# Altium footprint library d1_PcbLib.PcbLib: 266 footprints (part 9 of 17)
Each footprint in its own frame and in the unit in brackets; x right, y up, seen from the top. Pads: shape width x height; smd on the part's side, far side on the other; paste and mask are expansions set on the pad; w line width, h text height; cw(c..) or ccw(c..) is an arc to the next point about the centre after c.
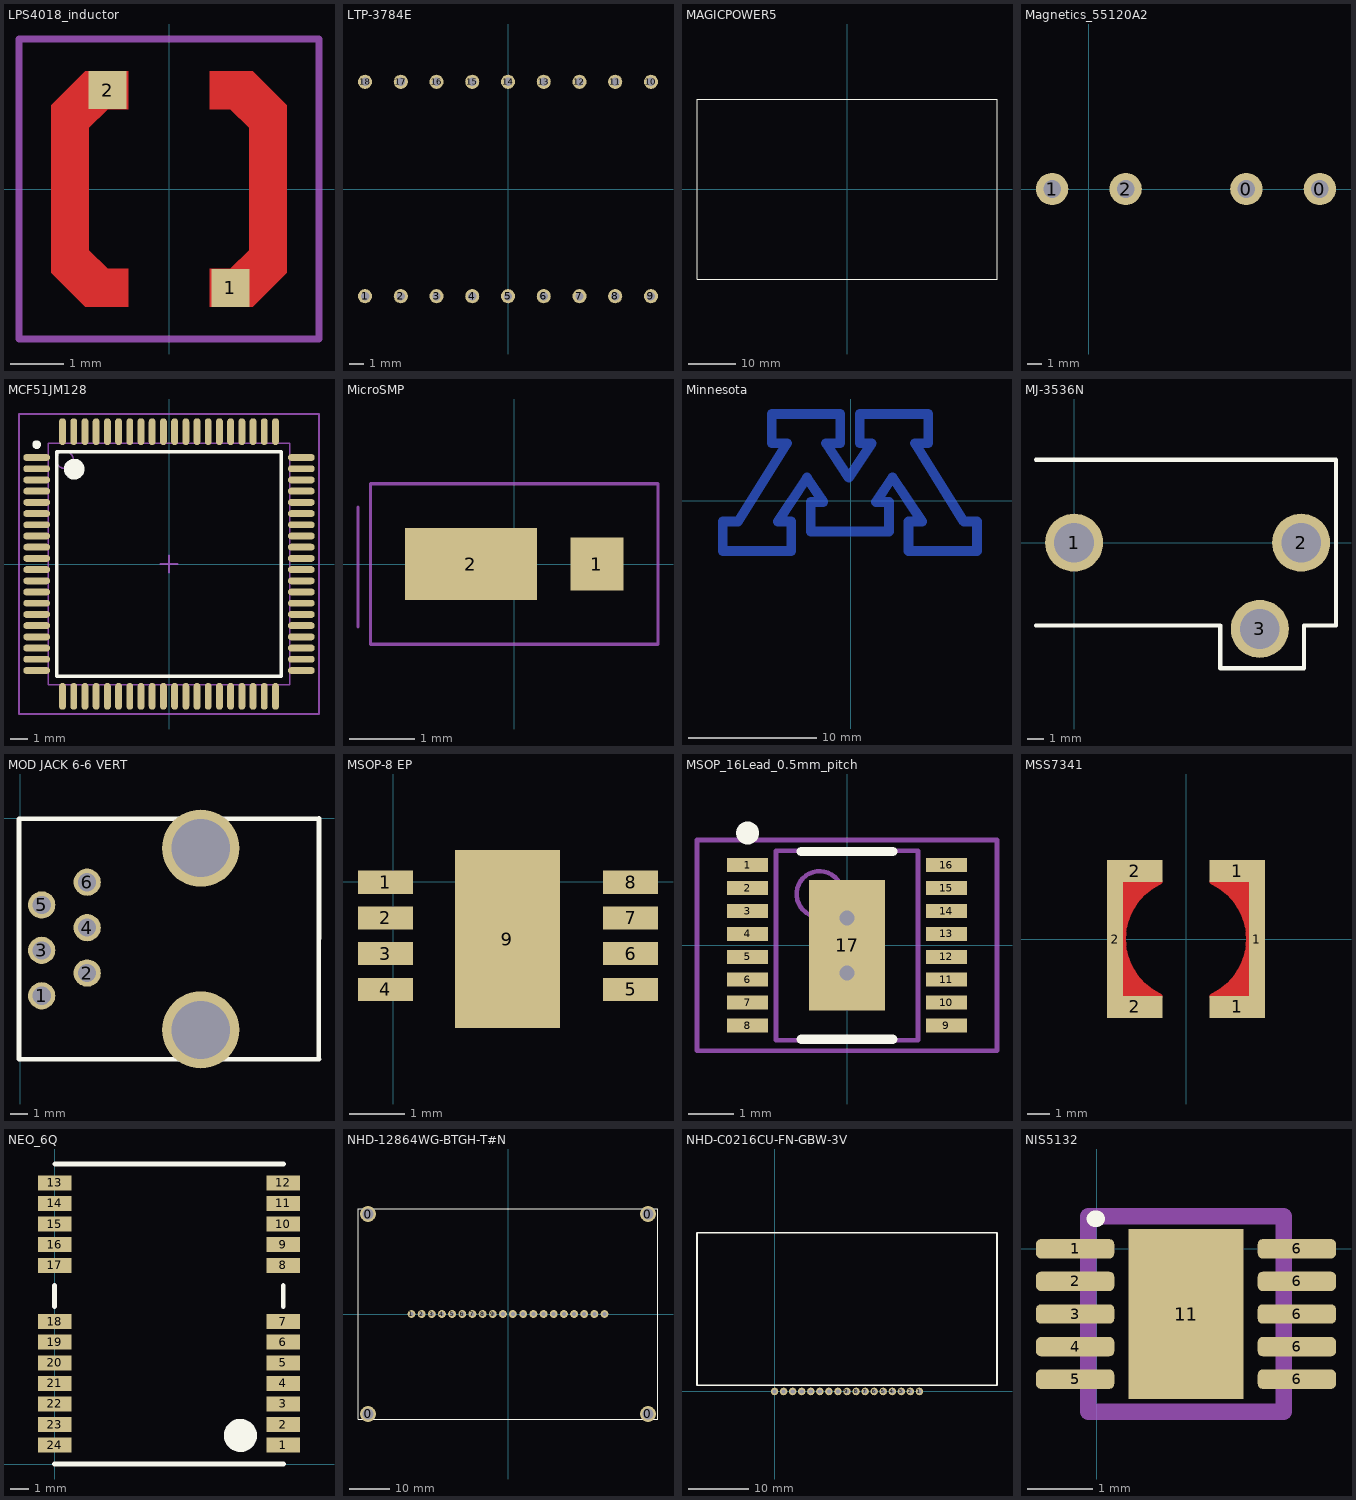
[diagram p8: the footprints below, top view; thin cyan lines are the x and y axes]

## LPS4018_inductor [mil]
height 66
pads (2):
  rect 28x28 smd: 1(45,-72.5) 2(-45,72.5)
Top Layer:
  region: -30,-58.5 -45,-58.5 -59,-45 -59,45 -45,58.5 -30,58.5 -30,86.5 -61.5,86.5 -86.5,61.5 -86.5,-61.5 -61.5,-86.5 -30,-86.5
  region: 30,58.5 45,58.5 59,45 59,-45 45,-58.5 30,-58.5 30,-86.5 61.5,-86.5 86.5,-61.5 86.5,61.5 61.5,86.5 30,86.5
Top Solder:
  region: -55,44.5 -45,54.5 -26,54.5 -26,90.5 -63.5,90.5 -90.5,63.5 -90.5,-63.5 -63.5,-90.5 -26,-90.5 -26,-54.5 -45,-54.5 -55,-45
  region: 55,-44.5 45,-54.5 26,-54.5 26,-90.5 63.5,-90.5 90.5,-63.5 90.5,63.5 63.5,90.5 26,90.5 26,54.5 45,54.5 55,45
Mechanical 15:
  lines w5: -110,-110 110,-110 110,110 -110,110 -110,-110
3D body: height 70.87, standoff 0, extent -80.82,-80.82 80.83,80.83

## LTP-3784E [mm]
pads (18):
  round 1 hole 0.6: 1(-10.16,-7.62) 2(-7.62,-7.62) 3(-5.08,-7.62) 4(-2.54,-7.62) 5(0,-7.62) 6(2.54,-7.62) 7(5.08,-7.62) 8(7.62,-7.62) 9(10.16,-7.62) 10(10.16,7.62) 11(7.62,7.62) 12(5.08,7.62) 13(2.54,7.62) 14(0,7.62) 15(-2.54,7.62) 16(-5.08,7.62) 17(-7.62,7.62) 18(-10.16,7.62)
3D body: height 7.8, standoff 0, extent -12.7,-10.16 12.7,10.16

## MAGICPOWER5 [mm]
Top Overlay:
  lines w0.254: -31.75,-19.05 -31.75,19.05 31.75,19.05 31.75,-19.05 -31.75,-19.05

## Magnetics_55120A2 [mm]
pads (4):
  round 2.2 hole 1.2: 0(10.7,0) 0(15.7,0) 1(-2.5,0) 2(2.5,0)
3D body: height 9.51, standoff 0.21, extent -3.031,-10.031 16.431,9.431

## MCF51JM128 [mm]
height 1.74
pads (80):
  oval 1.55x0.4 smd: 1(-7.675,6.175) 2(-7.675,5.525) 3(-7.675,4.875) 4(-7.675,4.225) 5(-7.675,3.575) 6(-7.675,2.925) 7(-7.675,2.275) 8(-7.675,1.625) 9(-7.675,0.975) 10(-7.675,0.325) 11(-7.675,-0.325) 12(-7.675,-0.975) 13(-7.675,-1.625) 14(-7.675,-2.275) 15(-7.675,-2.925) 16(-7.675,-3.575) 17(-7.675,-4.225) 18(-7.675,-4.875) 19(-7.675,-5.525) 20(-7.675,-6.175) 41(7.675,-6.175) 42(7.675,-5.525) 43(7.675,-4.875) 44(7.675,-4.225) 45(7.675,-3.575) 46(7.675,-2.925) 47(7.675,-2.275) 48(7.675,-1.625) 49(7.675,-0.975) 50(7.675,-0.325) 51(7.675,0.325) 52(7.675,0.975) 53(7.675,1.625) 54(7.675,2.275) 55(7.675,2.925) 56(7.675,3.575) 57(7.675,4.225) 58(7.675,4.875) 59(7.675,5.525) 60(7.675,6.175)
  oval 0.4x1.55 smd: 21(-6.175,-7.675) 22(-5.525,-7.675) 23(-4.875,-7.675) 24(-4.225,-7.675) 25(-3.575,-7.675) 26(-2.925,-7.675) 27(-2.275,-7.675) 28(-1.625,-7.675) 29(-0.975,-7.675) 30(-0.325,-7.675) 31(0.325,-7.675) 32(0.975,-7.675) 33(1.625,-7.675) 34(2.275,-7.675) 35(2.925,-7.675) 36(3.575,-7.675) 37(4.225,-7.675) 38(4.875,-7.675) 39(5.525,-7.675) 40(6.175,-7.675) 61(6.175,7.675) 62(5.525,7.675) 63(4.875,7.675) 64(4.225,7.675) 65(3.575,7.675) 66(2.925,7.675) 67(2.275,7.675) 68(1.625,7.675) 69(0.975,7.675) 70(0.325,7.675) 71(-0.325,7.675) 72(-0.975,7.675) 73(-1.625,7.675) 74(-2.275,7.675) 75(-2.925,7.675) 76(-3.575,7.675) 77(-4.225,7.675) 78(-4.875,7.675) 79(-5.525,7.675) 80(-6.175,7.675)
Top Overlay:
  circle w0.6: c-5.5,5.5 r0.3
  circle w0.25: c-7.675,6.925 r0.125
  lines w0.2: -6.5,-6.5 6.5,-6.5 6.5,6.5 -6.5,6.5 -6.5,-6.5
Mechanical 13:
  circle w0.1: c-6.05,6.05 r0.5
  lines w0.1: -7,-7 7,-7 7,7 -7,7 -7,-7
Mechanical 15:
  lines w0.1: -0.5,0 0.5,0 ; 0,-0.5 0,0.5 ; -8.7,-8.7 8.7,-8.7 8.7,8.7 -8.7,8.7 -8.7,-8.7
3D body: height 1.59, standoff 0, extent -8.001,-8.008 8.008,8.001

## MicroSMP [mil]
pads (2):
  rect 32x32 smd: 1(49.5,0)
  rect 79x43 smd: 2(-26,0)
Mechanical 15:
  lines w2: -93.5,-37.5 -93.5,34 ; -86,-48 86,-48 86,48 -86,48 -86,-48

## Minnesota [mm]
Bottom Layer:
  lines w0.762: -9.957,-3.912 -4.623,-3.912 -4.623,-1.626 -5.681,-1.626 -3.395,1.803 -2.125,-0.102 -3.099,-0.102 -3.099,-2.388 2.997,-2.388 2.997,-0.102 1.981,-0.102 3.272,1.835 5.58,-1.626 4.521,-1.626 4.521,-3.912 9.855,-3.912 9.855,-1.626 8.823,-1.626 5.013,4.47 6.045,4.47 6.045,6.756 0.711,6.756 0.711,4.47 1.643,4.47 -0.135,1.803 -1.913,4.47 -0.813,4.47 -0.813,6.756 -6.147,6.756 -6.147,4.47 -4.956,4.47 -8.766,-1.626 -9.957,-1.626 -9.957,-3.912
Bottom Solder:
  lines w0.762: -10.414,-16.612 -5.08,-16.612 -5.08,-14.326 -6.138,-14.326 -3.852,-10.897 -2.582,-12.802 -3.556,-12.802 -3.556,-15.088 2.54,-15.088 2.54,-12.802 1.524,-12.802 2.815,-10.865 5.122,-14.326 4.064,-14.326 4.064,-16.612 9.398,-16.612 9.398,-14.326 8.366,-14.326 4.556,-8.23 5.588,-8.23 5.588,-5.944 0.254,-5.944 0.254,-8.23 1.185,-8.23 -0.593,-10.897 -2.371,-8.23 -1.27,-8.23 -1.27,-5.944 -6.604,-5.944 -6.604,-8.23 -5.413,-8.23 -9.223,-14.326 -10.414,-14.326 -10.414,-16.612

## MJ-3536N [mm] "CONN AUDIO JACK"
pads (3):
  round 3.5 hole 2.4: 1(0,0) 2(13.7,0) 3(11.2,-5.2)
Top Overlay:
  lines w0.254: -2.3,-5 8.814,-5 8.814,-7.569 13.868,-7.569 13.868,-5 15.8,-5 15.8,5 -2.3,5

## MOD JACK 6-6 VERT [mil]
pads (8):
  round 60 hole 40: 1(47.24,-390.35) 2(147.24,-340.35) 3(47.24,-290.35) 4(147.24,-240.35) 5(47.24,-190.35) 6(147.24,-140.35)
  round 170 hole 128: ""(397.24,-465.35) ""(397.24,-65.35)
Top Overlay:
  lines w10: 657.24,-528.78 657.24,-263.78 ; 657.48,-530.35 -2.76,-530.35 -2.76,-0.35 657.48,-0.35 ; 657.48,-265 657.48,0

## MSOP-8 EP [mm]
pads (9):
  rect 1x0.42 smd: 1(-0.138,-0.008) 2(-0.138,-0.658) 3(-0.138,-1.308) 4(-0.138,-1.959) 5(4.322,-1.959) 6(4.322,-1.308) 7(4.322,-0.658) 8(4.322,-0.008)
  rect 1.905x3.248 smd: 9(2.083,-1.041)

## MSOP_16Lead_0.5mm_pitch [mm] "TSSOP, 16-Leads, Body 4.1x3.1mm (max), Pitch 0.50mm, IPC Medium Density"
height 1.1
pads (17):
  rect 0.889x0.305 smd: 1(-2.171,1.75) 2(-2.171,1.25) 3(-2.171,0.75) 4(-2.171,0.25) 5(-2.171,-0.25) 6(-2.171,-0.75) 7(-2.171,-1.25) 8(-2.171,-1.75) 9(2.17,-1.75) 10(2.17,-1.25) 11(2.17,-0.75) 12(2.17,-0.25) 13(2.17,0.25) 14(2.17,0.75) 15(2.17,1.25) 16(2.17,1.75)
  rect 1.651x2.845 smd: 17(0,0)
via 0,-0.6 diameter 0.66 hole 0.33
via 0,0.6 diameter 0.66 hole 0.33
Top Overlay:
  circle w0.25: c-2.171,2.452 r0.125
  lines w0.2: -1,-2.05 1,-2.05 ; -1,2.05 1,2.05
Mechanical 13:
  circle w0.1: c-0.6,1.12 r0.5
  lines w0.1: -1.55,-2.07 1.55,-2.07 1.55,2.07 -1.55,2.07 -1.55,-2.07
Mechanical 15:
  lines w0.1: -0.5,0 0.5,0 ; 0,-0.5 0,0.5 ; -3.275,-2.3 3.275,-2.3 3.275,2.3 -3.275,2.3 -3.275,-2.3
3D body: height 1.1, standoff 0.15, extent -1.55,-2.07 1.55,2.07

## MSS7341 [mm]
height 1.676
pads (6):
  rect 2.5x1 smd: 1(2.3,-3.05) 1(2.3,3.05) 2(-2.3,-3.05) 2(-2.3,3.05)
  rect 0.725x7.1 smd: 1(3.187,0) 2(-3.187,0)
Top Layer:
  region: 2.3,-1.7 2.6,-1.1 2.9,-0.6 2.9,-2.7 1.3,-2.7
  region: 1.4,2.6 1.5,2.4 2.2,1.9 2.9,0.7 2.9,2.6
  region: -1.4,-2.6 -1.5,-2.4 -2.2,-1.9 -2.9,-0.7 -2.9,-2.6
  region: -2.3,1.7 -2.6,1.1 -2.9,0.6 -2.9,2.7 -1.3,2.7
  lines w0.254: -1.184,-2.565 cw(c0,0) -1.184,2.565 ; 1.184,-2.565 ccw(c0,0) 1.184,2.565
Top Solder:
  region: 1.4,2.6 1.5,2.4 2.2,1.9 2.9,0.7 2.9,2.6
  region: 2.3,-1.7 2.6,-1.1 2.9,-0.6 2.9,-2.7 1.3,-2.7
  region: -2.3,1.7 -2.6,1.1 -2.9,0.6 -2.9,2.7 -1.3,2.7
  region: -1.4,-2.6 -1.5,-2.4 -2.2,-1.9 -2.9,-0.7 -2.9,-2.6
  lines w0.5: -1.184,-2.565 cw(c0,0) -1.184,2.565 ; 1.184,-2.565 ccw(c0,0) 1.184,2.565
3D body: height 4.05, standoff -0.05, extent -3.78,-3.78 3.75,3.78

## NEO_6Q [mm] "UBlox NEO-6Q"
pads (24):
  rect 1.8x0.8 smd: 1(12.2,1) 2(12.2,2.1) 3(12.2,3.2) 4(12.2,4.3) 5(12.2,5.4) 6(12.2,6.5) 7(12.2,7.6) 8(12.2,10.6) 9(12.2,11.7) 10(12.2,12.8) 11(12.2,13.9) 12(12.2,15) 13(0,15) 14(0,13.9) 15(0,12.8) 16(0,11.7) 17(0,10.6) 18(0,7.6) 19(0,6.5) 20(0,5.4) 21(0,4.3) 22(0,3.2) 23(0,2.1) 24(0,1)
Top Overlay:
  circle w1: c9.906,1.524 r0.381
  lines w0.254: 0,0 12.2,0 ; 0,8.384 0,9.525 ; 0.002,16 12.2,16 ; 12.192,8.382 12.192,9.525
Mechanical 2:
  text ".Designator" at 1.524,8.763 h1.52
3D body: height 2.4, standoff 0, extent 0,0 12.192,16.002

## NHD-12864WG-BTGH-T#N [mm]
pads (24):
  round 4 hole 2.75: 0(-35,-25) 0(-35,25) 0(35,-25) 0(35,25)
  round 2 hole 1: 1(-24.13,0) 2(-21.59,0) 3(-19.05,0) 4(-16.51,0) 5(-13.97,0) 6(-11.43,0) 7(-8.89,0) 8(-6.35,0) 9(-3.81,0) 10(-1.27,0) 11(1.2,0) 12(3.81,0) 13(6.35,0) 14(8.89,0) 15(11.43,0) 16(13.97,0) 17(16.51,0) 18(19.05,0) 19(21.59,0) 20(24.13,0)
Top Overlay:
  lines w0.254: -37.5,-26.35 -37.5,26.35 37.5,26.35 37.5,-26.35 -37.5,-26.35

## NHD-C0216CU-FN-GBW-3V [mm]
pads (17):
  round 1.25 hole 0.7: 1(24,0) 2(22.5,0) 3(21,0) 4(19.5,0) 5(18,0) 6(16.5,0) 7(15,0) 8(13.5,0) 9(12,0) 10(10.5,0) 11(9,0) 12(7.5,0) 13(6,0) 14(4.5,0) 15(3,0) 16(1.5,0) 17(0,0)
Top Overlay:
  lines w0.254: -12.85,1 36.85,1 36.85,26.3 -12.85,26.3 -12.85,1
3D body: height 2, standoff 0, extent -12.827,1.041 36.83,26.289

## NIS5132 [mm]
pads (11):
  rrect50% 1.2x0.297 smd: 1(-0.33,0) 2(-0.33,-0.5) 3(-0.33,-1) 4(-0.33,-1.5) 5(-0.33,-2) 6(3.07,-2) 6(3.07,-1.5) 6(3.07,-1) 6(3.07,-0.5) 6(3.07,0)
  rect 1.768x2.6 smd: 11(1.37,-1)
Top Overlay:
  lines w0.254: -0.025,0.457 0,0.457
Mechanical 13:
  lines w0.254: -0.13,-2.5 2.87,-2.5 2.87,0.5 -0.13,0.5 -0.13,-2.5
3D body: height 1, standoff 0, extent -0.13,-2.499 2.869,0.499